# Altium schematic symbol library SCHLIB.SchLib: 2608 symbols (part 12 of 20) (continued)
## R-3.9R-0603 (continued)
RES SMD 3.9 OHM 1% 1/10W 0603; Manufacturer Part Number: CRCW06033R90FKEA; Manufacturer: Vishay Dale; Tolerance: 0.01; Power: 0.1W; Temperature Coefficient: ±100ppm/°C; Object  Type: Part; Design Item ID: R-3.9R-0603; Value: 3.9R; Composition: Thick Film; Features: Automotive AEC-Q200; Operating Temperature: -55°C ~ 155°C; Height - Seated (Max): 0.50mm; Category: Resistor
footprint R0603
pins: 1, 2

## R-3.16K-0402
designator R?, comment Package: 0402  (hidden comment: 3.16K)
RES 3.16K OHM 1% 1/16W 0402; Manufacturer Part Number: RC0402FR-073K16L; Manufacturer: YAGEO; Tolerance: 0.01; Power: 0.063W; Temperature Coefficient: ±100ppm/°C; Object  Type: Part; Design Item ID: R-3.16K-0402; Value: 3.16K; Composition: Thick Film; Features: Moisture Resistant; Operating Temperature: -55°C ~ 155°C; Height - Seated (Max): 0.40mm; Category: Resistor
footprint R0402
pins: 1, 2

## R-3.16K-0603
designator R?, comment Package: 0603  (hidden comment: 3.16K)
RES SMD 3.16K OHM 1% 1/10W 0603; Manufacturer Part Number: CRCW06033K16FKEA; Manufacturer: Vishay Dale; Tolerance: 0.01; Power: 0.1W; Temperature Coefficient: ±100ppm/°C; Object  Type: Part; Design Item ID: R-3.16K-0603; Value: 3.16K; Composition: Thick Film; Features: Automotive AEC-Q200; Operating Temperature: -55°C ~ 155°C; Height - Seated (Max): 0.50mm; Category: Resistor
footprint R0603
pins: 1, 2

## R-3.16M-0603
designator R?, comment Package: 0603  (hidden comment: 3.16M)
RES SMD 3.16M OHM 1% 1/10W 0603; Manufacturer Part Number: CRCW06033M16FKEA; Manufacturer: Vishay Dale; Tolerance: 0.01; Power: 0.1W; Temperature Coefficient: ±100ppm/°C; Object  Type: Part; Design Item ID: R-3.16M-0603; Value: 3.16M; Composition: Thick Film; Features: Automotive AEC-Q200; Operating Temperature: -55°C ~ 155°C; Height - Seated (Max): 0.50mm; Category: Resistor
footprint R0603
pins: 1, 2

## R-3.16R-0603
designator R?, comment Package: 0603  (hidden comment: 3.16R)
RES SMD 3.16 OHM 1% 1/10W 0603; Manufacturer Part Number: CRCW06033R16FKEA; Manufacturer: Vishay Dale; Tolerance: 0.01; Power: 0.1W; Temperature Coefficient: ±100ppm/°C; Object  Type: Part; Design Item ID: R-3.16R-0603; Value: 3.16R; Composition: Thick Film; Features: Automotive AEC-Q200; Operating Temperature: -55°C ~ 155°C; Height - Seated (Max): 0.50mm; Category: Resistor
footprint R0603
pins: 1, 2

## R-3.24K-0402
designator R?, comment Package: 0402  (hidden comment: 3.24K)
RES 3.24K OHM 1% 1/16W 0402; Manufacturer Part Number: RC0402FR-073K24L; Manufacturer: YAGEO; Tolerance: 0.01; Power: 0.063W; Temperature Coefficient: ±100ppm/°C; Object  Type: Part; Design Item ID: R-3.24K-0402; Value: 3.24K; Composition: Thick Film; Features: Moisture Resistant; Operating Temperature: -55°C ~ 155°C; Height - Seated (Max): 0.40mm; Category: Resistor
footprint R0402
pins: 1, 2

## R-3.24K-0603
designator R?, comment Package: 0603  (hidden comment: 3.24K)
RES SMD 3.24K OHM 1% 1/10W 0603; Manufacturer Part Number: CRCW06033K24FKEA; Manufacturer: Vishay Dale; Tolerance: 0.01; Power: 0.1W; Temperature Coefficient: ±100ppm/°C; Object  Type: Part; Design Item ID: R-3.24K-0603; Value: 3.24K; Composition: Thick Film; Features: Automotive AEC-Q200; Operating Temperature: -55°C ~ 155°C; Height - Seated (Max): 0.50mm; Category: Resistor
footprint R0603
pins: 1, 2

## R-3.24M-0603
designator R?, comment Package: 0603  (hidden comment: 3.24M)
RES SMD 3.24M OHM 1% 1/10W 0603; Manufacturer Part Number: CRCW06033M24FKEA; Manufacturer: Vishay Dale; Tolerance: 0.01; Power: 0.1W; Temperature Coefficient: ±100ppm/°C; Object  Type: Part; Design Item ID: R-3.24M-0603; Value: 3.24M; Composition: Thick Film; Features: Automotive AEC-Q200; Operating Temperature: -55°C ~ 155°C; Height - Seated (Max): 0.50mm; Category: Resistor
footprint R0603
pins: 1, 2

## R-3.24R-0603
designator R?, comment Package: 0603  (hidden comment: 3.24R)
RES SMD 3.24 OHM 1% 1/10W 0603; Manufacturer Part Number: CRCW06033R24FKEA; Manufacturer: Vishay Dale; Tolerance: 0.01; Power: 0.1W; Temperature Coefficient: ±100ppm/°C; Object  Type: Part; Design Item ID: R-3.24R-0603; Value: 3.24R; Composition: Thick Film; Features: Automotive AEC-Q200; Operating Temperature: -55°C ~ 155°C; Height - Seated (Max): 0.50mm; Category: Resistor
footprint R0603
pins: 1, 2

## R-3.32K-0402
designator R?, comment Package: 0402  (hidden comment: 3.32K)
RES 3.32K OHM 1% 1/16W 0402; Manufacturer Part Number: RC0402FR-073K32L; Manufacturer: YAGEO; Tolerance: 0.01; Power: 0.063W; Temperature Coefficient: ±100ppm/°C; Object  Type: Part; Design Item ID: R-3.32K-0402; Value: 3.32K; Composition: Thick Film; Features: Moisture Resistant; Operating Temperature: -55°C ~ 155°C; Height - Seated (Max): 0.40mm; Category: Resistor
footprint R0402
pins: 1, 2

## R-3.32K-0603
designator R?, comment Package: 0603  (hidden comment: 3.32K)
RES SMD 3.32K OHM 1% 1/10W 0603; Manufacturer Part Number: CRCW06033K32FKEA; Manufacturer: Vishay Dale; Tolerance: 0.01; Power: 0.1W; Temperature Coefficient: ±100ppm/°C; Object  Type: Part; Design Item ID: R-3.32K-0603; Value: 3.32K; Composition: Thick Film; Features: Automotive AEC-Q200; Operating Temperature: -55°C ~ 155°C; Height - Seated (Max): 0.50mm; Category: Resistor
footprint R0603
pins: 1, 2

## R-3.32M-0402
designator R?, comment Package: 0402  (hidden comment: 3.32M)
RES 3.32M OHM 1% 1/16W 0402; Manufacturer Part Number: RC0402FR-073M32L; Manufacturer: YAGEO; Tolerance: 0.01; Power: 0.063W; Temperature Coefficient: ±100ppm/°C; Object  Type: Part; Design Item ID: R-3.32M-0402; Value: 3.32M; Composition: Thick Film; Features: Moisture Resistant; Operating Temperature: -55°C ~ 155°C; Height - Seated (Max): 0.40mm; Category: Resistor
footprint R0402
pins: 1, 2

## R-3.32M-0603
designator R?, comment Package: 0603  (hidden comment: 3.32M)
RES SMD 3.32M OHM 1% 1/10W 0603; Manufacturer Part Number: CRCW06033M32FKEA; Manufacturer: Vishay Dale; Tolerance: 0.01; Power: 0.1W; Temperature Coefficient: ±100ppm/°C; Object  Type: Part; Design Item ID: R-3.32M-0603; Value: 3.32M; Composition: Thick Film; Features: Automotive AEC-Q200; Operating Temperature: -55°C ~ 155°C; Height - Seated (Max): 0.50mm; Category: Resistor
footprint R0603
pins: 1, 2

## R-3.32R-0603
designator R?, comment Package: 0603  (hidden comment: 3.32R)
RES SMD 3.32 OHM 1% 1/10W 0603; Manufacturer Part Number: CRCW06033R32FKEA; Manufacturer: Vishay Dale; Tolerance: 0.01; Power: 0.1W; Temperature Coefficient: ±100ppm/°C; Object  Type: Part; Design Item ID: R-3.32R-0603; Value: 3.32R; Composition: Thick Film; Features: Automotive AEC-Q200; Operating Temperature: -55°C ~ 155°C; Height - Seated (Max): 0.50mm; Category: Resistor
footprint R0603
pins: 1, 2

## R-3.48K-0402
designator R?, comment Package: 0402  (hidden comment: 3.48K)
RES 3.48K OHM 1% 1/16W 0402; Manufacturer Part Number: RC0402FR-073K48L; Manufacturer: YAGEO; Tolerance: 0.01; Power: 0.063W; Temperature Coefficient: ±100ppm/°C; Object  Type: Part; Design Item ID: R-3.48K-0402; Value: 3.48K; Composition: Thick Film; Features: Moisture Resistant; Operating Temperature: -55°C ~ 155°C; Height - Seated (Max): 0.40mm; Category: Resistor
footprint R0402
pins: 1, 2

## R-3.48K-0603
designator R?, comment Package: 0603  (hidden comment: 3.48K)
RES SMD 3.48K OHM 1% 1/10W 0603; Manufacturer Part Number: CRCW06033K48FKEA; Manufacturer: Vishay Dale; Tolerance: 0.01; Power: 0.1W; Temperature Coefficient: ±100ppm/°C; Object  Type: Part; Design Item ID: R-3.48K-0603; Value: 3.48K; Composition: Thick Film; Features: Automotive AEC-Q200; Operating Temperature: -55°C ~ 155°C; Height - Seated (Max): 0.50mm; Category: Resistor
footprint R0603
pins: 1, 2

## R-3.48M-0603
designator R?, comment Package: 0603  (hidden comment: 3.48M)
RES SMD 3.48M OHM 1% 1/10W 0603; Manufacturer Part Number: CRCW06033M48FKEA; Manufacturer: Vishay Dale; Tolerance: 0.01; Power: 0.1W; Temperature Coefficient: ±100ppm/°C; Object  Type: Part; Design Item ID: R-3.48M-0603; Value: 3.48M; Composition: Thick Film; Features: Automotive AEC-Q200; Operating Temperature: -55°C ~ 155°C; Height - Seated (Max): 0.50mm; Category: Resistor
footprint R0603
pins: 1, 2

## R-3.48R-0603
designator R?, comment Package: 0603  (hidden comment: 3.48R)
RES SMD 3.48 OHM 1% 1/10W 0603; Manufacturer Part Number: CRCW06033R48FKEA; Manufacturer: Vishay Dale; Tolerance: 0.01; Power: 0.1W; Temperature Coefficient: ±100ppm/°C; Object  Type: Part; Design Item ID: R-3.48R-0603; Value: 3.48R; Composition: Thick Film; Features: Automotive AEC-Q200; Operating Temperature: -55°C ~ 155°C; Height - Seated (Max): 0.50mm; Category: Resistor
footprint R0603
pins: 1, 2

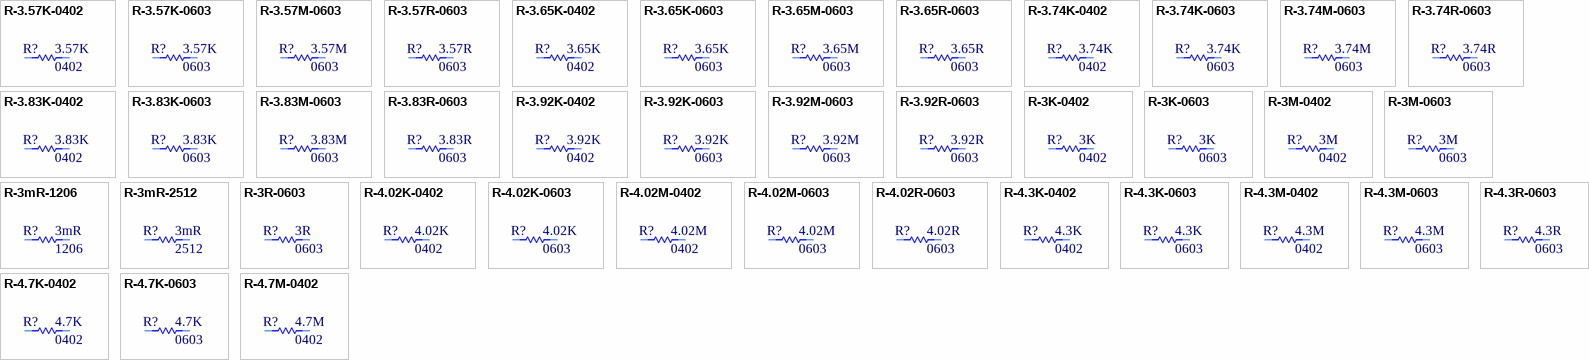
[diagram p51: symbols R-3.57K-0402 to R-4.7M-0402]

## R-3.57K-0402
designator R?, comment Package: 0402  (hidden comment: 3.57K)
RES 3.57K OHM 1% 1/16W 0402; Manufacturer Part Number: RC0402FR-073K57L; Manufacturer: YAGEO; Tolerance: 0.01; Power: 0.063W; Temperature Coefficient: ±100ppm/°C; Object  Type: Part; Design Item ID: R-3.57K-0402; Value: 3.57K; Composition: Thick Film; Features: Moisture Resistant; Operating Temperature: -55°C ~ 155°C; Height - Seated (Max): 0.40mm; Category: Resistor
footprint R0402
pins: 1, 2

## R-3.57K-0603
designator R?, comment Package: 0603  (hidden comment: 3.57K)
RES SMD 3.57K OHM 1% 1/10W 0603; Manufacturer Part Number: CRCW06033K57FKEA; Manufacturer: Vishay Dale; Tolerance: 0.01; Power: 0.1W; Temperature Coefficient: ±100ppm/°C; Object  Type: Part; Design Item ID: R-3.57K-0603; Value: 3.57K; Composition: Thick Film; Features: Automotive AEC-Q200; Operating Temperature: -55°C ~ 155°C; Height - Seated (Max): 0.50mm; Category: Resistor
footprint R0603
pins: 1, 2

## R-3.57M-0603
designator R?, comment Package: 0603  (hidden comment: 3.57M)
RES SMD 3.57M OHM 1% 1/10W 0603; Manufacturer Part Number: CRCW06033M57FKEA; Manufacturer: Vishay Dale; Tolerance: 0.01; Power: 0.1W; Temperature Coefficient: ±100ppm/°C; Object  Type: Part; Design Item ID: R-3.57M-0603; Value: 3.57M; Composition: Thick Film; Features: Automotive AEC-Q200; Operating Temperature: -55°C ~ 155°C; Height - Seated (Max): 0.50mm; Category: Resistor
footprint R0603
pins: 1, 2

## R-3.57R-0603
designator R?, comment Package: 0603  (hidden comment: 3.57R)
RES SMD 3.57 OHM 1% 1/10W 0603; Manufacturer Part Number: CRCW06033R57FKEA; Manufacturer: Vishay Dale; Tolerance: 0.01; Power: 0.1W; Temperature Coefficient: ±100ppm/°C; Object  Type: Part; Design Item ID: R-3.57R-0603; Value: 3.57R; Composition: Thick Film; Features: Automotive AEC-Q200; Operating Temperature: -55°C ~ 155°C; Height - Seated (Max): 0.50mm; Category: Resistor
footprint R0603
pins: 1, 2

## R-3.65K-0402
designator R?, comment Package: 0402  (hidden comment: 3.65K)
RES 3.65K OHM 1% 1/16W 0402; Manufacturer Part Number: RC0402FR-073K65L; Manufacturer: YAGEO; Tolerance: 0.01; Power: 0.063W; Temperature Coefficient: ±100ppm/°C; Object  Type: Part; Design Item ID: R-3.65K-0402; Value: 3.65K; Composition: Thick Film; Features: Moisture Resistant; Operating Temperature: -55°C ~ 155°C; Height - Seated (Max): 0.40mm; Category: Resistor
footprint R0402
pins: 1, 2

## R-3.65K-0603
designator R?, comment Package: 0603  (hidden comment: 3.65K)
RES SMD 3.65K OHM 1% 1/10W 0603; Manufacturer Part Number: CRCW06033K65FKEA; Manufacturer: Vishay Dale; Tolerance: 0.01; Power: 0.1W; Temperature Coefficient: ±100ppm/°C; Object  Type: Part; Design Item ID: R-3.65K-0603; Value: 3.65K; Composition: Thick Film; Features: Automotive AEC-Q200; Operating Temperature: -55°C ~ 155°C; Height - Seated (Max): 0.50mm; Category: Resistor
footprint R0603
pins: 1, 2

## R-3.65M-0603
designator R?, comment Package: 0603  (hidden comment: 3.65M)
RES SMD 3.65M OHM 1% 1/10W 0603; Manufacturer Part Number: CRCW06033M65FKEA; Manufacturer: Vishay Dale; Tolerance: 0.01; Power: 0.1W; Temperature Coefficient: ±100ppm/°C; Object  Type: Part; Design Item ID: R-3.65M-0603; Value: 3.65M; Composition: Thick Film; Features: Automotive AEC-Q200; Operating Temperature: -55°C ~ 155°C; Height - Seated (Max): 0.50mm; Category: Resistor
footprint R0603
pins: 1, 2

## R-3.65R-0603
designator R?, comment Package: 0603  (hidden comment: 3.65R)
RES SMD 3.65 OHM 1% 1/10W 0603; Manufacturer Part Number: CRCW06033R65FKEA; Manufacturer: Vishay Dale; Tolerance: 0.01; Power: 0.1W; Temperature Coefficient: ±100ppm/°C; Object  Type: Part; Design Item ID: R-3.65R-0603; Value: 3.65R; Composition: Thick Film; Features: Automotive AEC-Q200; Operating Temperature: -55°C ~ 155°C; Height - Seated (Max): 0.50mm; Category: Resistor
footprint R0603
pins: 1, 2

## R-3.74K-0402
designator R?, comment Package: 0402  (hidden comment: 3.74K)
RES 3.74K OHM 1% 1/16W 0402; Manufacturer Part Number: RC0402FR-073K74L; Manufacturer: YAGEO; Tolerance: 0.01; Power: 0.063W; Temperature Coefficient: ±100ppm/°C; Object  Type: Part; Design Item ID: R-3.74K-0402; Value: 3.74K; Composition: Thick Film; Features: Moisture Resistant; Operating Temperature: -55°C ~ 155°C; Height - Seated (Max): 0.40mm; Category: Resistor
footprint R0402
pins: 1, 2

## R-3.74K-0603
designator R?, comment Package: 0603  (hidden comment: 3.74K)
RES SMD 3.74K OHM 1% 1/10W 0603; Manufacturer Part Number: CRCW06033K74FKEA; Manufacturer: Vishay Dale; Tolerance: 0.01; Power: 0.1W; Temperature Coefficient: ±100ppm/°C; Object  Type: Part; Design Item ID: R-3.74K-0603; Value: 3.74K; Composition: Thick Film; Features: Automotive AEC-Q200; Operating Temperature: -55°C ~ 155°C; Height - Seated (Max): 0.50mm; Category: Resistor
footprint R0603
pins: 1, 2

## R-3.74M-0603
designator R?, comment Package: 0603  (hidden comment: 3.74M)
RES SMD 3.74M OHM 1% 1/10W 0603; Manufacturer Part Number: CRCW06033M74FKEA; Manufacturer: Vishay Dale; Tolerance: 0.01; Power: 0.1W; Temperature Coefficient: ±100ppm/°C; Object  Type: Part; Design Item ID: R-3.74M-0603; Value: 3.74M; Composition: Thick Film; Features: Automotive AEC-Q200; Operating Temperature: -55°C ~ 155°C; Height - Seated (Max): 0.50mm; Category: Resistor
footprint R0603
pins: 1, 2

## R-3.74R-0603
designator R?, comment Package: 0603  (hidden comment: 3.74R)
RES SMD 3.74 OHM 1% 1/10W 0603; Manufacturer Part Number: CRCW06033R74FKEA; Manufacturer: Vishay Dale; Tolerance: 0.01; Power: 0.1W; Temperature Coefficient: ±100ppm/°C; Object  Type: Part; Design Item ID: R-3.74R-0603; Value: 3.74R; Composition: Thick Film; Features: Automotive AEC-Q200; Operating Temperature: -55°C ~ 155°C; Height - Seated (Max): 0.50mm; Category: Resistor
footprint R0603
pins: 1, 2

## R-3.83K-0402
designator R?, comment Package: 0402  (hidden comment: 3.83K)
RES 3.83K OHM 1% 1/16W 0402; Manufacturer Part Number: RC0402FR-073K83L; Manufacturer: YAGEO; Tolerance: 0.01; Power: 0.063W; Temperature Coefficient: ±100ppm/°C; Object  Type: Part; Design Item ID: R-3.83K-0402; Value: 3.83K; Composition: Thick Film; Features: Moisture Resistant; Operating Temperature: -55°C ~ 155°C; Height - Seated (Max): 0.40mm; Category: Resistor
footprint R0402
pins: 1, 2

## R-3.83K-0603
designator R?, comment Package: 0603  (hidden comment: 3.83K)
RES SMD 3.83K OHM 1% 1/10W 0603; Manufacturer Part Number: CRCW06033K83FKEA; Manufacturer: Vishay Dale; Tolerance: 0.01; Power: 0.1W; Temperature Coefficient: ±100ppm/°C; Object  Type: Part; Design Item ID: R-3.83K-0603; Value: 3.83K; Composition: Thick Film; Features: Automotive AEC-Q200; Operating Temperature: -55°C ~ 155°C; Height - Seated (Max): 0.50mm; Category: Resistor
footprint R0603
pins: 1, 2

## R-3.83M-0603
designator R?, comment Package: 0603  (hidden comment: 3.83M)
RES SMD 3.83M OHM 1% 1/10W 0603; Manufacturer Part Number: CRCW06033M83FKEA; Manufacturer: Vishay Dale; Tolerance: 0.01; Power: 0.1W; Temperature Coefficient: ±100ppm/°C; Object  Type: Part; Design Item ID: R-3.83M-0603; Value: 3.83M; Composition: Thick Film; Features: Automotive AEC-Q200; Operating Temperature: -55°C ~ 155°C; Height - Seated (Max): 0.50mm; Category: Resistor
footprint R0603
pins: 1, 2

## R-3.83R-0603
designator R?, comment Package: 0603  (hidden comment: 3.83R)
RES SMD 3.83 OHM 1% 1/10W 0603; Manufacturer Part Number: CRCW06033R83FKEA; Manufacturer: Vishay Dale; Tolerance: 0.01; Power: 0.1W; Temperature Coefficient: ±100ppm/°C; Object  Type: Part; Design Item ID: R-3.83R-0603; Value: 3.83R; Composition: Thick Film; Features: Automotive AEC-Q200; Operating Temperature: -55°C ~ 155°C; Height - Seated (Max): 0.50mm; Category: Resistor
footprint R0603
pins: 1, 2

## R-3.92K-0402
designator R?, comment Package: 0402  (hidden comment: 3.92K)
RES 3.92K OHM 1% 1/16W 0402; Manufacturer Part Number: RC0402FR-073K92L; Manufacturer: YAGEO; Tolerance: 0.01; Power: 0.063W; Temperature Coefficient: ±100ppm/°C; Object  Type: Part; Design Item ID: R-3.92K-0402; Value: 3.92K; Composition: Thick Film; Features: Moisture Resistant; Operating Temperature: -55°C ~ 155°C; Height - Seated (Max): 0.40mm; Category: Resistor
footprint R0402
pins: 1, 2

## R-3.92K-0603
designator R?, comment Package: 0603  (hidden comment: 3.92K)
RES SMD 3.92K OHM 1% 1/10W 0603; Manufacturer Part Number: CRCW06033K92FKEA; Manufacturer: Vishay Dale; Tolerance: 0.01; Power: 0.1W; Temperature Coefficient: ±100ppm/°C; Object  Type: Part; Design Item ID: R-3.92K-0603; Value: 3.92K; Composition: Thick Film; Features: Automotive AEC-Q200; Operating Temperature: -55°C ~ 155°C; Height - Seated (Max): 0.50mm; Category: Resistor
footprint R0603
pins: 1, 2

## R-3.92M-0603
designator R?, comment Package: 0603  (hidden comment: 3.92M)
RES SMD 3.92M OHM 1% 1/10W 0603; Manufacturer Part Number: CRCW06033M92FKEA; Manufacturer: Vishay Dale; Tolerance: 0.01; Power: 0.1W; Temperature Coefficient: ±100ppm/°C; Object  Type: Part; Design Item ID: R-3.92M-0603; Value: 3.92M; Composition: Thick Film; Features: Automotive AEC-Q200; Operating Temperature: -55°C ~ 155°C; Height - Seated (Max): 0.50mm; Category: Resistor
footprint R0603
pins: 1, 2

## R-3.92R-0603
designator R?, comment Package: 0603  (hidden comment: 3.92R)
RES SMD 3.92 OHM 1% 1/10W 0603; Manufacturer Part Number: CRCW06033R92FKEA; Manufacturer: Vishay Dale; Tolerance: 0.01; Power: 0.1W; Temperature Coefficient: ±100ppm/°C; Object  Type: Part; Design Item ID: R-3.92R-0603; Value: 3.92R; Composition: Thick Film; Features: Automotive AEC-Q200; Operating Temperature: -55°C ~ 155°C; Height - Seated (Max): 0.50mm; Category: Resistor
footprint R0603
pins: 1, 2

## R-3K-0402
designator R?, comment Package: 0402  (hidden comment: 3K)
RES 3K OHM 1% 1/16W 0402; Manufacturer Part Number: RC0402FR-073KL; Manufacturer: YAGEO; Tolerance: 0.01; Power: 0.063W; Temperature Coefficient: ±100ppm/°C; Object  Type: Part; Design Item ID: R-3K-0402; Value: 3K; Composition: Thick Film; Features: Moisture Resistant; Operating Temperature: -55°C ~ 155°C; Height - Seated (Max): 0.40mm; Category: Resistor
footprint R0402
pins: 1, 2

## R-3K-0603
designator R?, comment Package: 0603  (hidden comment: 3K)
RES SMD 3K OHM 1% 1/10W 0603; Manufacturer Part Number: CRCW06033K00FKEA; Manufacturer: Vishay Dale; Tolerance: 0.01; Power: 0.1W; Temperature Coefficient: ±100ppm/°C; Object  Type: Part; Design Item ID: R-3K-0603; Value: 3K; Composition: Thick Film; Features: Automotive AEC-Q200; Operating Temperature: -55°C ~ 155°C; Height - Seated (Max): 0.50mm; Category: Resistor
footprint R0603
pins: 1, 2

## R-3M-0402
designator R?, comment Package: 0402  (hidden comment: 3M)
RES 3M OHM 1% 1/16W 0402; Manufacturer Part Number: RC0402FR-073ML; Manufacturer: YAGEO; Tolerance: 0.01; Power: 0.063W; Temperature Coefficient: ±100ppm/°C; Object  Type: Part; Design Item ID: R-3M-0402; Value: 3M; Composition: Thick Film; Features: Moisture Resistant; Operating Temperature: -55°C ~ 155°C; Height - Seated (Max): 0.40mm; Category: Resistor
footprint R0402
pins: 1, 2

## R-3M-0603
designator R?, comment Package: 0603  (hidden comment: 3M)
RES SMD 3M OHM 1% 1/10W 0603; Manufacturer Part Number: CRCW06033M00FKEA; Manufacturer: Vishay Dale; Tolerance: 0.01; Power: 0.1W; Temperature Coefficient: ±100ppm/°C; Object  Type: Part; Design Item ID: R-3M-0603; Value: 3M; Composition: Thick Film; Features: Automotive AEC-Q200; Operating Temperature: -55°C ~ 155°C; Height - Seated (Max): 0.50mm; Category: Resistor
footprint R0603
pins: 1, 2

## R-3mR-1206
designator R?, comment Package: 1206  (hidden comment: 3mR)
RES 0.003 OHM 1% 1/4W 1206; Manufacturer Part Number: WSL12063L000FEA; Manufacturer: Vishay Dale; Tolerance: 0.01; Power: 0.25W; Temperature Coefficient: ±150ppm/°C; Object  Type: Part; Design Item ID: R-3mR-1206; Value: 3mR; Composition: Metal Element; Features: Anti-Sulfur, Automotive AEC-Q200, Current Sense, Moisture Resistant, Pulse Withstanding; Operating Temperature: -65°C ~ 170°C; Height - Seated (Max): 0.89mm; Category: Resistor
footprint R1206
pins: 1, 2

## R-3mR-2512
designator R?, comment Package: 2512  (hidden comment: 3mR)
RES 0.003 OHM 1% 1W 2512; Manufacturer Part Number: WSL25123L000FEA; Manufacturer: Vishay Dale; Tolerance: 0.01; Temperature Coefficient: ±150ppm/°C; Object  Type: Part; Design Item ID: R-3mR-2512; Value: 3mR; Power: 1W; Composition: Metal Element; Features: Anti-Sulfur, Automotive AEC-Q200, Current Sense, Moisture Resistant, Pulse Withstanding; Operating Temperature: -65°C ~ 170°C; Height - Seated (Max): 0.89mm; Category: Resistor
footprint R2512
pins: 1, 2

## R-3R-0603
designator R?, comment Package: 0603  (hidden comment: 3R)
RES SMD 3 OHM 1% 1/10W 0603; Manufacturer Part Number: CRCW06033R00FKEA; Manufacturer: Vishay Dale; Tolerance: 0.01; Power: 0.1W; Temperature Coefficient: ±100ppm/°C; Object  Type: Part; Design Item ID: R-3R-0603; Value: 3R; Composition: Thick Film; Features: Automotive AEC-Q200; Operating Temperature: -55°C ~ 155°C; Height - Seated (Max): 0.50mm; Category: Resistor
footprint R0603
pins: 1, 2

## R-4.02K-0402
designator R?, comment Package: 0402  (hidden comment: 4.02K)
RES 4.02K OHM 1% 1/16W 0402; Manufacturer Part Number: RC0402FR-074K02L; Manufacturer: YAGEO; Tolerance: 0.01; Power: 0.063W; Temperature Coefficient: ±100ppm/°C; Object  Type: Part; Design Item ID: R-4.02K-0402; Value: 4.02K; Composition: Thick Film; Features: Moisture Resistant; Operating Temperature: -55°C ~ 155°C; Height - Seated (Max): 0.40mm; Category: Resistor
footprint R0402
pins: 1, 2

## R-4.02K-0603
designator R?, comment Package: 0603  (hidden comment: 4.02K)
RES SMD 4.02K OHM 1% 1/10W 0603; Manufacturer Part Number: CRCW06034K02FKEA; Manufacturer: Vishay Dale; Tolerance: 0.01; Power: 0.1W; Temperature Coefficient: ±100ppm/°C; Object  Type: Part; Design Item ID: R-4.02K-0603; Value: 4.02K; Composition: Thick Film; Features: Automotive AEC-Q200; Operating Temperature: -55°C ~ 155°C; Height - Seated (Max): 0.50mm; Category: Resistor
footprint R0603
pins: 1, 2

## R-4.02M-0402
designator R?, comment Package: 0402  (hidden comment: 4.02M)
RES 4.02M OHM 1% 1/16W 0402; Manufacturer Part Number: RC0402FR-074M02L; Manufacturer: YAGEO; Tolerance: 0.01; Power: 0.063W; Temperature Coefficient: ±100ppm/°C; Object  Type: Part; Design Item ID: R-4.02M-0402; Value: 4.02M; Composition: Thick Film; Features: Moisture Resistant; Operating Temperature: -55°C ~ 155°C; Height - Seated (Max): 0.40mm; Category: Resistor
footprint R0402
pins: 1, 2

## R-4.02M-0603
designator R?, comment Package: 0603  (hidden comment: 4.02M)
RES SMD 4.02M OHM 1% 1/10W 0603; Manufacturer Part Number: CRCW06034M02FKEA; Manufacturer: Vishay Dale; Tolerance: 0.01; Power: 0.1W; Temperature Coefficient: ±100ppm/°C; Object  Type: Part; Design Item ID: R-4.02M-0603; Value: 4.02M; Composition: Thick Film; Features: Automotive AEC-Q200; Operating Temperature: -55°C ~ 155°C; Height - Seated (Max): 0.50mm; Category: Resistor
footprint R0603
pins: 1, 2

## R-4.02R-0603
designator R?, comment Package: 0603  (hidden comment: 4.02R)
RES SMD 4.02 OHM 1% 1/10W 0603; Manufacturer Part Number: CRCW06034R02FKEA; Manufacturer: Vishay Dale; Tolerance: 0.01; Power: 0.1W; Temperature Coefficient: ±100ppm/°C; Object  Type: Part; Design Item ID: R-4.02R-0603; Value: 4.02R; Composition: Thick Film; Features: Automotive AEC-Q200; Operating Temperature: -55°C ~ 155°C; Height - Seated (Max): 0.50mm; Category: Resistor
footprint R0603
pins: 1, 2

## R-4.3K-0402
designator R?, comment Package: 0402  (hidden comment: 4.3K)
RES 4.3K OHM 1% 1/16W 0402; Manufacturer Part Number: RC0402FR-074K3L; Manufacturer: YAGEO; Tolerance: 0.01; Power: 0.063W; Temperature Coefficient: ±100ppm/°C; Object  Type: Part; Design Item ID: R-4.3K-0402; Value: 4.3K; Composition: Thick Film; Features: Moisture Resistant; Operating Temperature: -55°C ~ 155°C; Height - Seated (Max): 0.40mm; Category: Resistor
footprint R0402
pins: 1, 2

## R-4.3K-0603
designator R?, comment Package: 0603  (hidden comment: 4.3K)
RES SMD 4.3K OHM 1% 1/10W 0603; Manufacturer Part Number: CRCW06034K30FKEA; Manufacturer: Vishay Dale; Tolerance: 0.01; Power: 0.1W; Temperature Coefficient: ±100ppm/°C; Object  Type: Part; Design Item ID: R-4.3K-0603; Value: 4.3K; Composition: Thick Film; Features: Automotive AEC-Q200; Operating Temperature: -55°C ~ 155°C; Height - Seated (Max): 0.50mm; Category: Resistor
footprint R0603
pins: 1, 2

## R-4.3M-0402
designator R?, comment Package: 0402  (hidden comment: 4.3M)
RES 4.3M OHM 1% 1/16W 0402; Manufacturer Part Number: RC0402FR-074M3L; Manufacturer: YAGEO; Tolerance: 0.01; Power: 0.063W; Temperature Coefficient: ±100ppm/°C; Object  Type: Part; Design Item ID: R-4.3M-0402; Value: 4.3M; Composition: Thick Film; Features: Moisture Resistant; Operating Temperature: -55°C ~ 155°C; Height - Seated (Max): 0.40mm; Category: Resistor
footprint R0402
pins: 1, 2

## R-4.3M-0603
designator R?, comment Package: 0603  (hidden comment: 4.3M)
RES SMD 4.3M OHM 1% 1/10W 0603; Manufacturer Part Number: CRCW06034M30FKEA; Manufacturer: Vishay Dale; Tolerance: 0.01; Power: 0.1W; Temperature Coefficient: ±100ppm/°C; Object  Type: Part; Design Item ID: R-4.3M-0603; Value: 4.3M; Composition: Thick Film; Features: Automotive AEC-Q200; Operating Temperature: -55°C ~ 155°C; Height - Seated (Max): 0.50mm; Category: Resistor
footprint R0603
pins: 1, 2

## R-4.3R-0603
designator R?, comment Package: 0603  (hidden comment: 4.3R)
RES SMD 4.3 OHM 1% 1/10W 0603; Manufacturer Part Number: CRCW06034R30FKEA; Manufacturer: Vishay Dale; Tolerance: 0.01; Power: 0.1W; Temperature Coefficient: ±100ppm/°C; Object  Type: Part; Design Item ID: R-4.3R-0603; Value: 4.3R; Composition: Thick Film; Features: Automotive AEC-Q200; Operating Temperature: -55°C ~ 155°C; Height - Seated (Max): 0.50mm; Category: Resistor
footprint R0603
pins: 1, 2

## R-4.7K-0402
designator R?, comment Package: 0402  (hidden comment: 4.7K)
RES 4.7K OHM 1% 1/16W 0402; Manufacturer Part Number: RC0402FR-074K7L; Manufacturer: YAGEO; Tolerance: 0.01; Power: 0.063W; Temperature Coefficient: ±100ppm/°C; Object  Type: Part; Design Item ID: R-4.7K-0402; Value: 4.7K; Composition: Thick Film; Features: Moisture Resistant; Operating Temperature: -55°C ~ 155°C; Height - Seated (Max): 0.40mm; Category: Resistor
footprint R0402
pins: 1, 2

## R-4.7K-0603
designator R?, comment Package: 0603  (hidden comment: 4.7K)
RES SMD 4.7K OHM 1% 1/10W 0603; Manufacturer Part Number: CRCW06034K70FKEA; Manufacturer: Vishay Dale; Tolerance: 0.01; Power: 0.1W; Temperature Coefficient: ±100ppm/°C; Object  Type: Part; Design Item ID: R-4.7K-0603; Value: 4.7K; Composition: Thick Film; Features: Automotive AEC-Q200; Operating Temperature: -55°C ~ 155°C; Height - Seated (Max): 0.50mm; Category: Resistor
footprint R0603
pins: 1, 2

## R-4.7M-0402
designator R?, comment Package: 0402  (hidden comment: 4.7M)
RES 4.7M OHM 1% 1/16W 0402; Manufacturer Part Number: RC0402FR-074M7L; Manufacturer: YAGEO; Tolerance: 0.01; Power: 0.063W; Temperature Coefficient: ±100ppm/°C; Object  Type: Part; Design Item ID: R-4.7M-0402; Value: 4.7M; Composition: Thick Film; Features: Moisture Resistant; Operating Temperature: -55°C ~ 155°C; Height - Seated (Max): 0.40mm; Category: Resistor
footprint R0402
pins: 1, 2

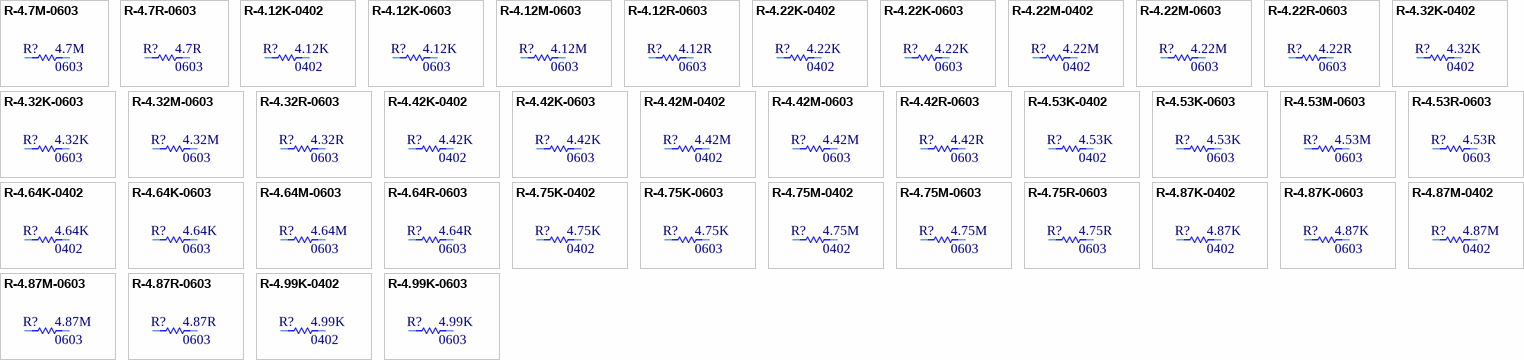
[diagram p52: symbols R-4.7M-0603 to R-4.99K-0603]

## R-4.7M-0603
designator R?, comment Package: 0603  (hidden comment: 4.7M)
RES SMD 4.7M OHM 1% 1/10W 0603; Manufacturer Part Number: CRCW06034M70FKEA; Manufacturer: Vishay Dale; Tolerance: 0.01; Power: 0.1W; Temperature Coefficient: ±100ppm/°C; Object  Type: Part; Design Item ID: R-4.7M-0603; Value: 4.7M; Composition: Thick Film; Features: Automotive AEC-Q200; Operating Temperature: -55°C ~ 155°C; Height - Seated (Max): 0.50mm; Category: Resistor
footprint R0603
pins: 1, 2

## R-4.7R-0603
designator R?, comment Package: 0603  (hidden comment: 4.7R)
RES SMD 4.7 OHM 1% 1/10W 0603; Manufacturer Part Number: CRCW06034R70FKEA; Manufacturer: Vishay Dale; Tolerance: 0.01; Power: 0.1W; Temperature Coefficient: ±100ppm/°C; Object  Type: Part; Design Item ID: R-4.7R-0603; Value: 4.7R; Composition: Thick Film; Features: Automotive AEC-Q200; Operating Temperature: -55°C ~ 155°C; Height - Seated (Max): 0.50mm; Category: Resistor
footprint R0603
pins: 1, 2

## R-4.12K-0402
designator R?, comment Package: 0402  (hidden comment: 4.12K)
RES 4.12K OHM 1% 1/16W 0402; Manufacturer Part Number: RC0402FR-074K12L; Manufacturer: YAGEO; Tolerance: 0.01; Power: 0.063W; Temperature Coefficient: ±100ppm/°C; Object  Type: Part; Design Item ID: R-4.12K-0402; Value: 4.12K; Composition: Thick Film; Features: Moisture Resistant; Operating Temperature: -55°C ~ 155°C; Height - Seated (Max): 0.40mm; Category: Resistor
footprint R0402
pins: 1, 2

## R-4.12K-0603
designator R?, comment Package: 0603  (hidden comment: 4.12K)
RES SMD 4.12K OHM 1% 1/10W 0603; Manufacturer Part Number: CRCW06034K12FKEA; Manufacturer: Vishay Dale; Tolerance: 0.01; Power: 0.1W; Temperature Coefficient: ±100ppm/°C; Object  Type: Part; Design Item ID: R-4.12K-0603; Value: 4.12K; Composition: Thick Film; Features: Automotive AEC-Q200; Operating Temperature: -55°C ~ 155°C; Height - Seated (Max): 0.50mm; Category: Resistor
footprint R0603
pins: 1, 2

## R-4.12M-0603
designator R?, comment Package: 0603  (hidden comment: 4.12M)
RES SMD 4.12M OHM 1% 1/10W 0603; Manufacturer Part Number: CRCW06034M12FKEA; Manufacturer: Vishay Dale; Tolerance: 0.01; Power: 0.1W; Temperature Coefficient: ±100ppm/°C; Object  Type: Part; Design Item ID: R-4.12M-0603; Value: 4.12M; Composition: Thick Film; Features: Automotive AEC-Q200; Operating Temperature: -55°C ~ 155°C; Height - Seated (Max): 0.50mm; Category: Resistor
footprint R0603
pins: 1, 2

## R-4.12R-0603
designator R?, comment Package: 0603  (hidden comment: 4.12R)
RES SMD 4.12 OHM 1% 1/10W 0603; Manufacturer Part Number: CRCW06034R12FKEA; Manufacturer: Vishay Dale; Tolerance: 0.01; Power: 0.1W; Temperature Coefficient: ±100ppm/°C; Object  Type: Part; Design Item ID: R-4.12R-0603; Value: 4.12R; Composition: Thick Film; Features: Automotive AEC-Q200; Operating Temperature: -55°C ~ 155°C; Height - Seated (Max): 0.50mm; Category: Resistor
footprint R0603
pins: 1, 2

## R-4.22K-0402
designator R?, comment Package: 0402  (hidden comment: 4.22K)
RES 4.22K OHM 1% 1/16W 0402; Manufacturer Part Number: RC0402FR-074K22L; Manufacturer: YAGEO; Tolerance: 0.01; Power: 0.063W; Temperature Coefficient: ±100ppm/°C; Object  Type: Part; Design Item ID: R-4.22K-0402; Value: 4.22K; Composition: Thick Film; Features: Moisture Resistant; Operating Temperature: -55°C ~ 155°C; Height - Seated (Max): 0.40mm; Category: Resistor
footprint R0402
pins: 1, 2

## R-4.22K-0603
designator R?, comment Package: 0603  (hidden comment: 4.22K)
RES SMD 4.22K OHM 1% 1/10W 0603; Manufacturer Part Number: CRCW06034K22FKEA; Manufacturer: Vishay Dale; Tolerance: 0.01; Power: 0.1W; Temperature Coefficient: ±100ppm/°C; Object  Type: Part; Design Item ID: R-4.22K-0603; Value: 4.22K; Composition: Thick Film; Features: Automotive AEC-Q200; Operating Temperature: -55°C ~ 155°C; Height - Seated (Max): 0.50mm; Category: Resistor
footprint R0603
pins: 1, 2

## R-4.22M-0402
designator R?, comment Package: 0402  (hidden comment: 4.22M)
RES 4.22M OHM 1% 1/16W 0402; Manufacturer Part Number: RC0402FR-074M22L; Manufacturer: YAGEO; Tolerance: 0.01; Power: 0.063W; Temperature Coefficient: ±100ppm/°C; Object  Type: Part; Design Item ID: R-4.22M-0402; Value: 4.22M; Composition: Thick Film; Features: Moisture Resistant; Operating Temperature: -55°C ~ 155°C; Height - Seated (Max): 0.40mm; Category: Resistor
footprint R0402
pins: 1, 2

## R-4.22M-0603
designator R?, comment Package: 0603  (hidden comment: 4.22M)
RES SMD 4.22M OHM 1% 1/10W 0603; Manufacturer Part Number: CRCW06034M22FKEA; Manufacturer: Vishay Dale; Tolerance: 0.01; Power: 0.1W; Temperature Coefficient: ±100ppm/°C; Object  Type: Part; Design Item ID: R-4.22M-0603; Value: 4.22M; Composition: Thick Film; Features: Automotive AEC-Q200; Operating Temperature: -55°C ~ 155°C; Height - Seated (Max): 0.50mm; Category: Resistor
footprint R0603
pins: 1, 2

## R-4.22R-0603
designator R?, comment Package: 0603  (hidden comment: 4.22R)
RES SMD 4.22 OHM 1% 1/10W 0603; Manufacturer Part Number: CRCW06034R22FKEA; Manufacturer: Vishay Dale; Tolerance: 0.01; Power: 0.1W; Temperature Coefficient: ±100ppm/°C; Object  Type: Part; Design Item ID: R-4.22R-0603; Value: 4.22R; Composition: Thick Film; Features: Automotive AEC-Q200; Operating Temperature: -55°C ~ 155°C; Height - Seated (Max): 0.50mm; Category: Resistor
footprint R0603
pins: 1, 2

## R-4.32K-0402
designator R?, comment Package: 0402  (hidden comment: 4.32K)
RES 4.32K OHM 1% 1/16W 0402; Manufacturer Part Number: RC0402FR-074K32L; Manufacturer: YAGEO; Tolerance: 0.01; Power: 0.063W; Temperature Coefficient: ±100ppm/°C; Object  Type: Part; Design Item ID: R-4.32K-0402; Value: 4.32K; Composition: Thick Film; Features: Moisture Resistant; Operating Temperature: -55°C ~ 155°C; Height - Seated (Max): 0.40mm; Category: Resistor
footprint R0402
pins: 1, 2

## R-4.32K-0603
designator R?, comment Package: 0603  (hidden comment: 4.32K)
RES SMD 4.32K OHM 1% 1/10W 0603; Manufacturer Part Number: CRCW06034K32FKEA; Manufacturer: Vishay Dale; Tolerance: 0.01; Power: 0.1W; Temperature Coefficient: ±100ppm/°C; Object  Type: Part; Design Item ID: R-4.32K-0603; Value: 4.32K; Composition: Thick Film; Features: Automotive AEC-Q200; Operating Temperature: -55°C ~ 155°C; Height - Seated (Max): 0.50mm; Category: Resistor
footprint R0603
pins: 1, 2

## R-4.32M-0603
designator R?, comment Package: 0603  (hidden comment: 4.32M)
RES SMD 4.32M OHM 1% 1/10W 0603; Manufacturer Part Number: CRCW06034M32FKEA; Manufacturer: Vishay Dale; Tolerance: 0.01; Power: 0.1W; Temperature Coefficient: ±100ppm/°C; Object  Type: Part; Design Item ID: R-4.32M-0603; Value: 4.32M; Composition: Thick Film; Features: Automotive AEC-Q200; Operating Temperature: -55°C ~ 155°C; Height - Seated (Max): 0.50mm; Category: Resistor
footprint R0603
pins: 1, 2

## R-4.32R-0603
designator R?, comment Package: 0603  (hidden comment: 4.32R)
RES SMD 4.32 OHM 1% 1/10W 0603; Manufacturer Part Number: CRCW06034R32FKEA; Manufacturer: Vishay Dale; Tolerance: 0.01; Power: 0.1W; Temperature Coefficient: ±100ppm/°C; Object  Type: Part; Design Item ID: R-4.32R-0603; Value: 4.32R; Composition: Thick Film; Features: Automotive AEC-Q200; Operating Temperature: -55°C ~ 155°C; Height - Seated (Max): 0.50mm; Category: Resistor
footprint R0603
pins: 1, 2

## R-4.42K-0402
designator R?, comment Package: 0402  (hidden comment: 4.42K)
RES 4.42K OHM 1% 1/16W 0402; Manufacturer Part Number: RC0402FR-074K42L; Manufacturer: YAGEO; Tolerance: 0.01; Power: 0.063W; Temperature Coefficient: ±100ppm/°C; Object  Type: Part; Design Item ID: R-4.42K-0402; Value: 4.42K; Composition: Thick Film; Features: Moisture Resistant; Operating Temperature: -55°C ~ 155°C; Height - Seated (Max): 0.40mm; Category: Resistor
footprint R0402
pins: 1, 2

## R-4.42K-0603
designator R?, comment Package: 0603  (hidden comment: 4.42K)
RES SMD 4.42K OHM 1% 1/10W 0603; Manufacturer Part Number: CRCW06034K42FKEA; Manufacturer: Vishay Dale; Tolerance: 0.01; Power: 0.1W; Temperature Coefficient: ±100ppm/°C; Object  Type: Part; Design Item ID: R-4.42K-0603; Value: 4.42K; Composition: Thick Film; Features: Automotive AEC-Q200; Operating Temperature: -55°C ~ 155°C; Height - Seated (Max): 0.50mm; Category: Resistor
footprint R0603
pins: 1, 2

## R-4.42M-0402
designator R?, comment Package: 0402  (hidden comment: 4.42M)
RES 4.42M OHM 1% 1/16W 0402; Manufacturer Part Number: RC0402FR-074M42L; Manufacturer: YAGEO; Tolerance: 0.01; Power: 0.063W; Temperature Coefficient: ±100ppm/°C; Object  Type: Part; Design Item ID: R-4.42M-0402; Value: 4.42M; Composition: Thick Film; Features: Moisture Resistant; Operating Temperature: -55°C ~ 155°C; Height - Seated (Max): 0.40mm; Category: Resistor
footprint R0402
pins: 1, 2

## R-4.42M-0603
designator R?, comment Package: 0603  (hidden comment: 4.42M)
RES SMD 4.42M OHM 1% 1/10W 0603; Manufacturer Part Number: CRCW06034M42FKEA; Manufacturer: Vishay Dale; Tolerance: 0.01; Power: 0.1W; Temperature Coefficient: ±100ppm/°C; Object  Type: Part; Design Item ID: R-4.42M-0603; Value: 4.42M; Composition: Thick Film; Features: Automotive AEC-Q200; Operating Temperature: -55°C ~ 155°C; Height - Seated (Max): 0.50mm; Category: Resistor
footprint R0603
pins: 1, 2

## R-4.42R-0603
designator R?, comment Package: 0603  (hidden comment: 4.42R)
RES SMD 4.42 OHM 1% 1/10W 0603; Manufacturer Part Number: CRCW06034R42FKEA; Manufacturer: Vishay Dale; Tolerance: 0.01; Power: 0.1W; Temperature Coefficient: ±100ppm/°C; Object  Type: Part; Design Item ID: R-4.42R-0603; Value: 4.42R; Composition: Thick Film; Features: Automotive AEC-Q200; Operating Temperature: -55°C ~ 155°C; Height - Seated (Max): 0.50mm; Category: Resistor
footprint R0603
pins: 1, 2

## R-4.53K-0402
designator R?, comment Package: 0402  (hidden comment: 4.53K)
RES 4.53K OHM 1% 1/16W 0402; Manufacturer Part Number: RC0402FR-074K53L; Manufacturer: YAGEO; Tolerance: 0.01; Power: 0.063W; Temperature Coefficient: ±100ppm/°C; Object  Type: Part; Design Item ID: R-4.53K-0402; Value: 4.53K; Composition: Thick Film; Features: Moisture Resistant; Operating Temperature: -55°C ~ 155°C; Height - Seated (Max): 0.40mm; Category: Resistor
footprint R0402
pins: 1, 2

## R-4.53K-0603
designator R?, comment Package: 0603  (hidden comment: 4.53K)
RES SMD 4.53K OHM 1% 1/10W 0603; Manufacturer Part Number: CRCW06034K53FKEA; Manufacturer: Vishay Dale; Tolerance: 0.01; Power: 0.1W; Temperature Coefficient: ±100ppm/°C; Object  Type: Part; Design Item ID: R-4.53K-0603; Value: 4.53K; Composition: Thick Film; Features: Automotive AEC-Q200; Operating Temperature: -55°C ~ 155°C; Height - Seated (Max): 0.50mm; Category: Resistor
footprint R0603
pins: 1, 2

## R-4.53M-0603
designator R?, comment Package: 0603  (hidden comment: 4.53M)
RES SMD 4.53M OHM 1% 1/10W 0603; Manufacturer Part Number: CRCW06034M53FKEA; Manufacturer: Vishay Dale; Tolerance: 0.01; Power: 0.1W; Temperature Coefficient: ±100ppm/°C; Object  Type: Part; Design Item ID: R-4.53M-0603; Value: 4.53M; Composition: Thick Film; Features: Automotive AEC-Q200; Operating Temperature: -55°C ~ 155°C; Height - Seated (Max): 0.50mm; Category: Resistor
footprint R0603
pins: 1, 2

## R-4.53R-0603
designator R?, comment Package: 0603  (hidden comment: 4.53R)
RES SMD 4.53 OHM 1% 1/10W 0603; Manufacturer Part Number: CRCW06034R53FKEA; Manufacturer: Vishay Dale; Tolerance: 0.01; Power: 0.1W; Temperature Coefficient: ±100ppm/°C; Object  Type: Part; Design Item ID: R-4.53R-0603; Value: 4.53R; Composition: Thick Film; Features: Automotive AEC-Q200; Operating Temperature: -55°C ~ 155°C; Height - Seated (Max): 0.50mm; Category: Resistor
footprint R0603
pins: 1, 2

## R-4.64K-0402
designator R?, comment Package: 0402  (hidden comment: 4.64K)
RES 4.64K OHM 1% 1/16W 0402; Manufacturer Part Number: RC0402FR-074K64L; Manufacturer: YAGEO; Tolerance: 0.01; Power: 0.063W; Temperature Coefficient: ±100ppm/°C; Object  Type: Part; Design Item ID: R-4.64K-0402; Value: 4.64K; Composition: Thick Film; Features: Moisture Resistant; Operating Temperature: -55°C ~ 155°C; Height - Seated (Max): 0.40mm; Category: Resistor
footprint R0402
pins: 1, 2

## R-4.64K-0603
designator R?, comment Package: 0603  (hidden comment: 4.64K)
RES SMD 4.64K OHM 1% 1/10W 0603; Manufacturer Part Number: CRCW06034K64FKEA; Manufacturer: Vishay Dale; Tolerance: 0.01; Power: 0.1W; Temperature Coefficient: ±100ppm/°C; Object  Type: Part; Design Item ID: R-4.64K-0603; Value: 4.64K; Composition: Thick Film; Features: Automotive AEC-Q200; Operating Temperature: -55°C ~ 155°C; Height - Seated (Max): 0.50mm; Category: Resistor
footprint R0603
pins: 1, 2

## R-4.64M-0603
designator R?, comment Package: 0603  (hidden comment: 4.64M)
RES SMD 4.64M OHM 1% 1/10W 0603; Manufacturer Part Number: CRCW06034M64FKEA; Manufacturer: Vishay Dale; Tolerance: 0.01; Power: 0.1W; Temperature Coefficient: ±100ppm/°C; Object  Type: Part; Design Item ID: R-4.64M-0603; Value: 4.64M; Composition: Thick Film; Features: Automotive AEC-Q200; Operating Temperature: -55°C ~ 155°C; Height - Seated (Max): 0.50mm; Category: Resistor
footprint R0603
pins: 1, 2

## R-4.64R-0603
designator R?, comment Package: 0603  (hidden comment: 4.64R)
RES SMD 4.64 OHM 1% 1/10W 0603; Manufacturer Part Number: CRCW06034R64FKEA; Manufacturer: Vishay Dale; Tolerance: 0.01; Power: 0.1W; Temperature Coefficient: ±100ppm/°C; Object  Type: Part; Design Item ID: R-4.64R-0603; Value: 4.64R; Composition: Thick Film; Features: Automotive AEC-Q200; Operating Temperature: -55°C ~ 155°C; Height - Seated (Max): 0.50mm; Category: Resistor
footprint R0603
pins: 1, 2

## R-4.75K-0402
designator R?, comment Package: 0402  (hidden comment: 4.75K)
RES 4.75K OHM 1% 1/16W 0402; Manufacturer Part Number: RC0402FR-074K75L; Manufacturer: YAGEO; Tolerance: 0.01; Power: 0.063W; Temperature Coefficient: ±100ppm/°C; Object  Type: Part; Design Item ID: R-4.75K-0402; Value: 4.75K; Composition: Thick Film; Features: Moisture Resistant; Operating Temperature: -55°C ~ 155°C; Height - Seated (Max): 0.40mm; Category: Resistor
footprint R0402
pins: 1, 2

## R-4.75K-0603
designator R?, comment Package: 0603  (hidden comment: 4.75K)
RES SMD 4.75K OHM 1% 1/10W 0603; Manufacturer Part Number: CRCW06034K75FKEA; Manufacturer: Vishay Dale; Tolerance: 0.01; Power: 0.1W; Temperature Coefficient: ±100ppm/°C; Object  Type: Part; Design Item ID: R-4.75K-0603; Value: 4.75K; Composition: Thick Film; Features: Automotive AEC-Q200; Operating Temperature: -55°C ~ 155°C; Height - Seated (Max): 0.50mm; Category: Resistor
footprint R0603
pins: 1, 2